# Altium footprint library Gen_Connectors.PcbLib: 199 footprints (part 12 of 13)
Each footprint in its own frame and in the unit in brackets; x right, y up, seen from the top. Pads: shape width x height; smd on the part's side, far side on the other; paste and mask are expansions set on the pad; w line width, h text height; cw(c..) or ccw(c..) is an arc to the next point about the centre after c.
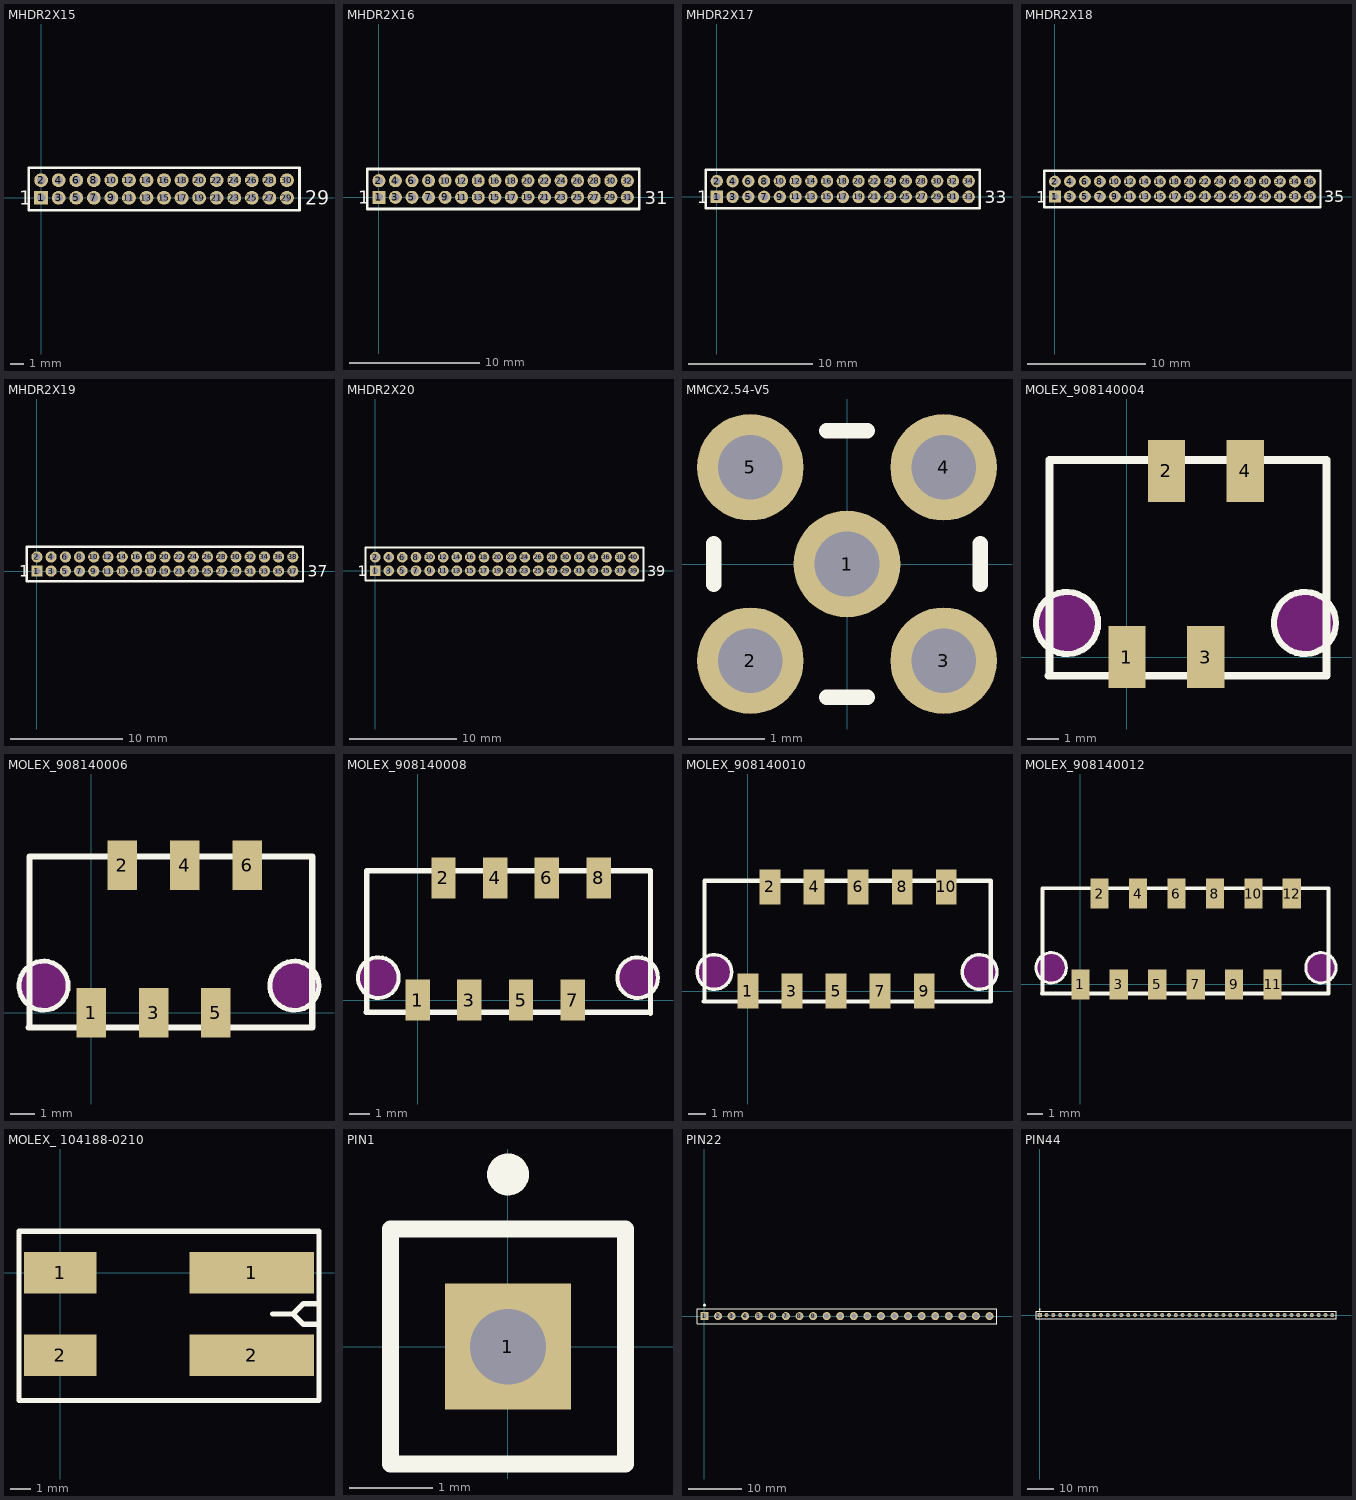
[diagram p11: the footprints below, top view; thin cyan lines are the x and y axes]

## MHDR2X15 [mm] "Connector; Header; 15x2 Position"
pads (30):
  rect 1x1 hole 0.6: 1(0,0)
  round 1 hole 0.6: 2(0,1.27) 3(1.27,0) 4(1.27,1.27) 5(2.54,0) 6(2.54,1.27) 7(3.81,0) 8(3.81,1.27) 9(5.08,0) 10(5.08,1.27) 11(6.35,0) 12(6.35,1.27) 13(7.62,0) 14(7.62,1.27) 15(8.89,0) 16(8.89,1.27) 17(10.16,0) 18(10.16,1.27) 19(11.43,0) 20(11.43,1.27) 21(12.7,0) 22(12.7,1.27) 23(13.97,0) 24(13.97,1.27) 25(15.24,0) 26(15.24,1.27) 27(16.51,0) 28(16.51,1.27) 29(17.78,0) 30(17.78,1.27)
Top Overlay:
  lines w0.2: -0.9,-0.9 -0.9,2.17 18.68,2.17 18.68,-0.9 -0.9,-0.9
  text "29" at 19.1,-0.508 h1
  text "1" at -1.6,-0.508 h1

## MHDR2X16 [mm] "Connector; Header; 16x2 Position"
pads (32):
  rect 1x1 hole 0.6: 1(0,0)
  round 1 hole 0.6: 2(0,1.27) 3(1.27,0) 4(1.27,1.27) 5(2.54,0) 6(2.54,1.27) 7(3.81,0) 8(3.81,1.27) 9(5.08,0) 10(5.08,1.27) 11(6.35,0) 12(6.35,1.27) 13(7.62,0) 14(7.62,1.27) 15(8.89,0) 16(8.89,1.27) 17(10.16,0) 18(10.16,1.27) 19(11.43,0) 20(11.43,1.27) 21(12.7,0) 22(12.7,1.27) 23(13.97,0) 24(13.97,1.27) 25(15.24,0) 26(15.24,1.27) 27(16.51,0) 28(16.51,1.27) 29(17.78,0) 30(17.78,1.27) 31(19.05,0) 32(19.05,1.27)
Top Overlay:
  lines w0.2: -0.9,-0.9 -0.9,2.17 19.95,2.17 19.95,-0.9 -0.9,-0.9
  text "31" at 20.4,-0.522 h1
  text "1" at -1.6,-0.508 h1

## MHDR2X17 [mm] "Connector; Header; 17x2 Position"
pads (34):
  rect 1x1 hole 0.6: 1(0,0)
  round 1 hole 0.6: 2(0,1.27) 3(1.27,0) 4(1.27,1.27) 5(2.54,0) 6(2.54,1.27) 7(3.81,0) 8(3.81,1.27) 9(5.08,0) 10(5.08,1.27) 11(6.35,0) 12(6.35,1.27) 13(7.62,0) 14(7.62,1.27) 15(8.89,0) 16(8.89,1.27) 17(10.16,0) 18(10.16,1.27) 19(11.43,0) 20(11.43,1.27) 21(12.7,0) 22(12.7,1.27) 23(13.97,0) 24(13.97,1.27) 25(15.24,0) 26(15.24,1.27) 27(16.51,0) 28(16.51,1.27) 29(17.78,0) 30(17.78,1.27) 31(19.05,0) 32(19.05,1.27) 33(20.32,0) 34(20.32,1.27)
Top Overlay:
  lines w0.2: -0.9,-0.9 -0.9,2.17 21.22,2.17 21.22,-0.9 -0.9,-0.9
  text "33" at 21.6,-0.508 h1
  text "1" at -1.6,-0.508 h1

## MHDR2X18 [mm] "Connector; Header; 18x2 Position"
pads (36):
  rect 1x1 hole 0.6: 1(0,0)
  round 1 hole 0.6: 2(0,1.27) 3(1.27,0) 4(1.27,1.27) 5(2.54,0) 6(2.54,1.27) 7(3.81,0) 8(3.81,1.27) 9(5.08,0) 10(5.08,1.27) 11(6.35,0) 12(6.35,1.27) 13(7.62,0) 14(7.62,1.27) 15(8.89,0) 16(8.89,1.27) 17(10.16,0) 18(10.16,1.27) 19(11.43,0) 20(11.43,1.27) 21(12.7,0) 22(12.7,1.27) 23(13.97,0) 24(13.97,1.27) 25(15.24,0) 26(15.24,1.27) 27(16.51,0) 28(16.51,1.27) 29(17.78,0) 30(17.78,1.27) 31(19.05,0) 32(19.05,1.27) 33(20.32,0) 34(20.32,1.27) 35(21.59,0) 36(21.59,1.27)
Top Overlay:
  lines w0.2: -0.9,-0.9 -0.9,2.17 22.49,2.17 22.49,-0.9 -0.9,-0.9
  text "35" at 22.8,-0.501 h1
  text "1" at -1.6,-0.508 h1

## MHDR2X19 [mm] "Connector; Header; 19x2 Position"
pads (38):
  rect 1x1 hole 0.6: 1(0,0)
  round 1 hole 0.6: 2(0,1.27) 3(1.27,0) 4(1.27,1.27) 5(2.54,0) 6(2.54,1.27) 7(3.81,0) 8(3.81,1.27) 9(5.08,0) 10(5.08,1.27) 11(6.35,0) 12(6.35,1.27) 13(7.62,0) 14(7.62,1.27) 15(8.89,0) 16(8.89,1.27) 17(10.16,0) 18(10.16,1.27) 19(11.43,0) 20(11.43,1.27) 21(12.7,0) 22(12.7,1.27) 23(13.97,0) 24(13.97,1.27) 25(15.24,0) 26(15.24,1.27) 27(16.51,0) 28(16.51,1.27) 29(17.78,0) 30(17.78,1.27) 31(19.05,0) 32(19.05,1.27) 33(20.32,0) 34(20.32,1.27) 35(21.59,0) 36(21.59,1.27) 37(22.86,0) 38(22.86,1.27)
Top Overlay:
  lines w0.2: -0.9,-0.9 23.76,-0.9 23.76,2.17 -0.9,2.17 -0.9,-0.9
  text "1" at -1.6,-0.508 h1
  text "37" at 24.2,-0.508 h1

## MHDR2X20 [mm] "Connector; Header; 20x2 Position"
pads (40):
  rect 1x1 hole 0.6: 1(0,0)
  round 1 hole 0.6: 2(0,1.27) 3(1.27,0) 4(1.27,1.27) 5(2.54,0) 6(2.54,1.27) 7(3.81,0) 8(3.81,1.27) 9(5.08,0) 10(5.08,1.27) 11(6.35,0) 12(6.35,1.27) 13(7.62,0) 14(7.62,1.27) 15(8.89,0) 16(8.89,1.27) 17(10.16,0) 18(10.16,1.27) 19(11.43,0) 20(11.43,1.27) 21(12.7,0) 22(12.7,1.27) 23(13.97,0) 24(13.97,1.27) 25(15.24,0) 26(15.24,1.27) 27(16.51,0) 28(16.51,1.27) 29(17.78,0) 30(17.78,1.27) 31(19.05,0) 32(19.05,1.27) 33(20.32,0) 34(20.32,1.27) 35(21.59,0) 36(21.59,1.27) 37(22.86,0) 38(22.86,1.27) 39(24.13,0) 40(24.13,1.27)
Top Overlay:
  lines w0.2: -0.9,-0.9 25.03,-0.9 25.03,2.17 -0.9,2.17 -0.9,-0.9
  text "1" at -1.6,-0.508 h1
  text "39" at 25.4,-0.508 h1

## MMCX2.54-V5 [mm] "Connector; RF Coaxial, MMCX, Thru-Hole; 5 Position; Vertical"
height 4.45
pads (5):
  round 1.4 hole 0.85: 1(0,0) 2(-1.27,-1.27) 3(1.27,-1.27) 4(1.27,1.27) 5(-1.27,1.27)
Top Overlay:
  lines w0.2: -1.75,-0.27 -1.75,0.27 ; -0.27,-1.75 0.27,-1.75 ; -0.27,1.75 0.27,1.75 ; 1.75,-0.27 1.75,0.27

## MOLEX_908140004 [mm] "Connecteur MOLEX PicoFlex"
pads (4):
  rect 1.2x2 smd mask+0.2: 1(0,0) 2(1.27,6) 3(2.54,0) 4(3.81,6)
Top Overlay:
  circle w0.2: c5.73,1.1 r1
  circle w0.2: c-1.93,1.1 r1
  lines w0.254: -2.53,-0.6 6.425,-0.6 6.425,6.35 -2.5,6.35 -2.5,-0.55
Keep-Out Layer:
  board cut-out: -1.93,0.1 -2.028,0.1 -2.222,0.138 -2.404,0.214 -2.567,0.323 -2.707,0.463 -2.816,0.626 -2.892,0.808 -2.93,1.002 -2.93,1.1 -2.93,1.198 -2.892,1.392 -2.816,1.574 -2.707,1.737 -2.567,1.877 -2.404,1.986 -2.222,2.062 -2.028,2.1 -1.93,2.1 -1.832,2.1 -1.638,2.062 -1.456,1.986 -1.293,1.877 -1.153,1.737 -1.044,1.574 -0.968,1.392 -0.93,1.198 -0.93,1.1 -0.93,1.002 -0.968,0.808 -1.044,0.626 -1.153,0.463 -1.293,0.323 -1.456,0.214 -1.638,0.138 -1.832,0.1
  board cut-out: 4.73,1.1 4.73,1.002 4.768,0.808 4.844,0.626 4.953,0.463 5.093,0.323 5.256,0.214 5.438,0.138 5.632,0.1 5.73,0.1 5.828,0.1 6.022,0.138 6.204,0.214 6.367,0.323 6.507,0.463 6.616,0.626 6.692,0.808 6.73,1.002 6.73,1.1 6.73,1.198 6.692,1.392 6.616,1.574 6.507,1.737 6.367,1.877 6.204,1.986 6.022,2.062 5.828,2.1 5.73,2.1 5.632,2.1 5.438,2.062 5.256,1.986 5.093,1.877 4.953,1.737 4.844,1.574 4.768,1.392 4.73,1.198
3D body "908140004.stp": height 7.5, standoff -1.2, extent -2.58,-0.65 6.28,6.25

## MOLEX_908140006 [mm] "Connecteur MOLEX PicoFlex"
pads (6):
  rect 1.2x2 smd mask+0.2: 1(0,0) 2(1.27,6) 3(2.54,0) 4(3.81,6) 5(5.08,0) 6(6.35,6)
Top Overlay:
  circle w0.2: c-1.93,1.1 r1
  circle w0.2: c8.27,1.1 r1
  lines w0.254: -2.53,-0.6 9,-0.6 9,6.35 -2.5,6.35 -2.5,-0.55
Keep-Out Layer:
  board cut-out: -1.93,0.1 -2.028,0.1 -2.222,0.138 -2.404,0.214 -2.567,0.323 -2.707,0.463 -2.816,0.626 -2.892,0.808 -2.93,1.002 -2.93,1.1 -2.93,1.198 -2.892,1.392 -2.816,1.574 -2.707,1.737 -2.567,1.877 -2.404,1.986 -2.222,2.062 -2.028,2.1 -1.93,2.1 -1.832,2.1 -1.638,2.062 -1.456,1.986 -1.293,1.877 -1.153,1.737 -1.044,1.574 -0.968,1.392 -0.93,1.198 -0.93,1.1 -0.93,1.002 -0.968,0.808 -1.044,0.626 -1.153,0.463 -1.293,0.323 -1.456,0.214 -1.638,0.138 -1.832,0.1
  board cut-out: 7.27,1.1 7.27,1.002 7.308,0.808 7.384,0.626 7.493,0.463 7.633,0.323 7.796,0.214 7.978,0.138 8.172,0.1 8.27,0.1 8.368,0.1 8.562,0.138 8.744,0.214 8.907,0.323 9.047,0.463 9.156,0.626 9.232,0.808 9.27,1.002 9.27,1.1 9.27,1.198 9.232,1.392 9.156,1.574 9.047,1.737 8.907,1.877 8.744,1.986 8.562,2.062 8.368,2.1 8.27,2.1 8.172,2.1 7.978,2.062 7.796,1.986 7.633,1.877 7.493,1.737 7.384,1.574 7.308,1.392 7.27,1.198
3D body "908140006.stp": height 7.4, standoff -1.3, extent -2.4,-0.55 9,6.35

## MOLEX_908140008 [mm] "Connecteur MOLEX PicoFlex"
pads (8):
  rect 1.2x2 smd mask+0.2: 1(0,0) 2(1.27,6) 3(2.54,0) 4(3.81,6) 5(5.08,0) 6(6.35,6) 7(7.62,0) 8(8.89,6)
Top Overlay:
  circle w0.2: c10.81,1.1 r1
  circle w0.2: c-1.93,1.1 r1
  lines w0.254: -2.53,-0.6 11.41,-0.6 ; -2.5,-0.55 -2.5,6.35 11.44,6.35 ; 11.44,-0.65 11.44,6.25
Keep-Out Layer:
  board cut-out: 9.81,1.1 9.81,1.002 9.848,0.808 9.924,0.626 10.033,0.463 10.173,0.323 10.336,0.214 10.518,0.138 10.712,0.1 10.81,0.1 10.908,0.1 11.102,0.138 11.284,0.214 11.447,0.323 11.587,0.463 11.696,0.626 11.772,0.808 11.81,1.002 11.81,1.1 11.81,1.198 11.772,1.392 11.696,1.574 11.587,1.737 11.447,1.877 11.284,1.986 11.102,2.062 10.908,2.1 10.81,2.1 10.712,2.1 10.518,2.062 10.336,1.986 10.173,1.877 10.033,1.737 9.924,1.574 9.848,1.392 9.81,1.198
  board cut-out: -1.93,0.1 -2.028,0.1 -2.222,0.138 -2.404,0.214 -2.567,0.323 -2.707,0.463 -2.816,0.626 -2.892,0.808 -2.93,1.002 -2.93,1.1 -2.93,1.198 -2.892,1.392 -2.816,1.574 -2.707,1.737 -2.567,1.877 -2.404,1.986 -2.222,2.062 -2.028,2.1 -1.93,2.1 -1.832,2.1 -1.638,2.062 -1.456,1.986 -1.293,1.877 -1.153,1.737 -1.044,1.574 -0.968,1.392 -0.93,1.198 -0.93,1.1 -0.93,1.002 -0.968,0.808 -1.044,0.626 -1.153,0.463 -1.293,0.323 -1.456,0.214 -1.638,0.138 -1.832,0.1
3D body "908140008.stp": height 7.4, standoff -1.3, extent -2.5,-0.65 11.44,6.25

## MOLEX_908140010 [mm] "Connecteur MOLEX PicoFlex"
pads (10):
  rect 1.2x2 smd mask+0.2: 1(0,0) 2(1.27,6) 3(2.54,0) 4(3.81,6) 5(5.08,0) 6(6.35,6) 7(7.62,0) 8(8.89,6) 9(10.16,0) 10(11.43,6)
Top Overlay:
  circle w0.2: c13.35,1.1 r1
  circle w0.2: c-1.93,1.1 r1
  lines w0.254: -2.53,-0.6 14,-0.6 14,6.35 -2.5,6.35 -2.5,-0.55
Keep-Out Layer:
  board cut-out: -1.93,0.1 -2.028,0.1 -2.222,0.138 -2.404,0.214 -2.567,0.323 -2.707,0.463 -2.816,0.626 -2.892,0.808 -2.93,1.002 -2.93,1.1 -2.93,1.198 -2.892,1.392 -2.816,1.574 -2.707,1.737 -2.567,1.877 -2.404,1.986 -2.222,2.062 -2.028,2.1 -1.93,2.1 -1.832,2.1 -1.638,2.062 -1.456,1.986 -1.293,1.877 -1.153,1.737 -1.044,1.574 -0.968,1.392 -0.93,1.198 -0.93,1.1 -0.93,1.002 -0.968,0.808 -1.044,0.626 -1.153,0.463 -1.293,0.323 -1.456,0.214 -1.638,0.138 -1.832,0.1
  board cut-out: 12.35,1.1 12.35,1.002 12.388,0.808 12.464,0.626 12.573,0.463 12.713,0.323 12.876,0.214 13.058,0.138 13.252,0.1 13.35,0.1 13.448,0.1 13.642,0.138 13.824,0.214 13.987,0.323 14.127,0.463 14.236,0.626 14.312,0.808 14.35,1.002 14.35,1.1 14.35,1.198 14.312,1.392 14.236,1.574 14.127,1.737 13.987,1.877 13.824,1.986 13.642,2.062 13.448,2.1 13.35,2.1 13.252,2.1 13.058,2.062 12.876,1.986 12.713,1.877 12.573,1.737 12.464,1.574 12.388,1.392 12.35,1.198
3D body "908140010.stp": height 7.4, standoff -1.3, extent -2.54,-0.55 13.94,6.35

## MOLEX_908140012 [mm] "Connecteur MOLEX PicoFlex"
pads (12):
  rect 1.2x2 smd mask+0.2: 1(0,0) 2(1.27,6) 3(2.54,0) 4(3.81,6) 5(5.08,0) 6(6.35,6) 7(7.62,0) 8(8.89,6) 9(10.16,0) 10(11.43,6) 11(12.7,0) 12(13.97,6)
Top Overlay:
  circle w0.2: c15.89,1.1 r1
  circle w0.2: c-1.93,1.1 r1
  lines w0.254: -2.53,-0.6 16.4,-0.6 16.4,6.35 -2.5,6.35 -2.5,-0.55
Keep-Out Layer:
  board cut-out: -1.93,0.1 -2.028,0.1 -2.222,0.138 -2.404,0.214 -2.567,0.323 -2.707,0.463 -2.816,0.626 -2.892,0.808 -2.93,1.002 -2.93,1.1 -2.93,1.198 -2.892,1.392 -2.816,1.574 -2.707,1.737 -2.567,1.877 -2.404,1.986 -2.222,2.062 -2.028,2.1 -1.93,2.1 -1.832,2.1 -1.638,2.062 -1.456,1.986 -1.293,1.877 -1.153,1.737 -1.044,1.574 -0.968,1.392 -0.93,1.198 -0.93,1.1 -0.93,1.002 -0.968,0.808 -1.044,0.626 -1.153,0.463 -1.293,0.323 -1.456,0.214 -1.638,0.138 -1.832,0.1
  board cut-out: 14.89,1.1 14.89,1.002 14.928,0.808 15.004,0.626 15.113,0.463 15.253,0.323 15.416,0.214 15.598,0.138 15.792,0.1 15.89,0.1 15.988,0.1 16.182,0.138 16.364,0.214 16.527,0.323 16.667,0.463 16.776,0.626 16.852,0.808 16.89,1.002 16.89,1.1 16.89,1.198 16.852,1.392 16.776,1.574 16.667,1.737 16.527,1.877 16.364,1.986 16.182,2.062 15.988,2.1 15.89,2.1 15.792,2.1 15.598,2.062 15.416,1.986 15.253,1.877 15.113,1.737 15.004,1.574 14.928,1.392 14.89,1.198
3D body "908140012.stp": height 7.4, standoff -1.3, extent -2.61,-0.55 16.41,6.35

## MOLEX_ 104188-0210 [mm]
pads (4):
  rect 3.5x2 smd: 1(0,0) 2(0,-4)
  rect 6x2 smd: 1(9.25,0) 2(9.25,-4)
Top Overlay:
  lines w0.254: 12.5,-2.5 12,-2.5 11.75,-2.5 11.25,-2 ; 12.5,-1.5 12,-1.5 11.75,-1.5 11.25,-2 ; 10.25,-2 10.25,-2 ; 10.25,-2 11.25,-2 ; 11.25,-2 11.25,-2 ; -2,-6.175 12.5,-6.175 12.5,2 -2,2 -2,-6.175
3D body "1041880210.stp": height -0.4, standoff -4.65, extent -1.525,-6.05 11.475,1.85

## PIN1 [mm] "Connector; Plug"
pads (1):
  rect 1.5x1.5 hole 0.9: 1(0,0)
Top Overlay:
  circle w0.25: c0,2.05 r0.125
  lines w0.2: -1.4,-1.4 1.4,-1.4 1.4,1.4 -1.4,1.4 -1.4,-1.4

## PIN22 [mm] "Connector; Edge; 22 Position"
pads (22):
  rect 1.5x1.5 hole 0.9: 1(0,0)
  round 1.5 hole 0.9: 2(2.54,0) 3(5.08,0) 4(7.62,0) 5(10.16,0) 6(12.7,0) 7(15.24,0) 8(17.78,0) 10(22.86,0) 11(25.4,0) 12(27.94,0) 13(30.48,0) 14(33.02,0) 15(35.56,0) 16(38.1,0) 17(40.64,0) 18(43.18,0) 19(45.72,0) 20(48.26,0) 21(50.8,0) 22(53.34,0)
  oval 1.51x1.5 hole 0.9: 9(20.32,0)
Top Overlay:
  circle w0.25: c0,2.05 r0.125
  lines w0.2: -1.4,-1.4 54.74,-1.4 54.74,1.4 -1.4,1.4 -1.4,-1.4

## PIN44 [mm] "Connector; Edge; 44 Position"
pads (44):
  rect 1.5x1.5 hole 0.9: 1(0,0)
  round 1.5 hole 0.9: 2(2.54,0) 3(5.08,0) 4(7.62,0) 5(10.16,0) 6(12.7,0) 7(15.24,0) 8(17.78,0) 10(22.86,0) 11(25.4,0) 12(27.94,0) 13(30.48,0) 14(33.02,0) 15(35.56,0) 16(38.1,0) 17(40.64,0) 18(43.18,0) 19(45.72,0) 20(48.26,0) 21(50.8,0) 22(53.34,0) 23(55.88,0) 24(58.42,0) 25(60.96,0) 26(63.5,0) 27(66.04,0) 28(68.58,0) 29(71.12,0) 30(73.66,0) 31(76.2,0) 32(78.74,0) 33(81.28,0) 34(83.82,0) 35(86.36,0) 36(88.9,0) 37(91.44,0) 38(93.98,0) 39(96.52,0) 40(99.06,0) 41(101.6,0) 42(104.14,0) 43(106.68,0) 44(109.22,0)
  oval 1.51x1.5 hole 0.9: 9(20.32,0)
Top Overlay:
  circle w0.25: c0,2.05 r0.125
  lines w0.2: -1.4,-1.4 110.62,-1.4 110.62,1.4 -1.4,1.4 -1.4,-1.4